# Altium footprint library ARCOM_Chips.PcbLib: 185 footprints (part 4 of 12)
Each footprint in its own frame and in the unit in brackets; x right, y up, seen from the top. Pads: shape width x height; smd on the part's side, far side on the other; paste and mask are expansions set on the pad; w line width, h text height; cw(c..) or ccw(c..) is an arc to the next point about the centre after c.
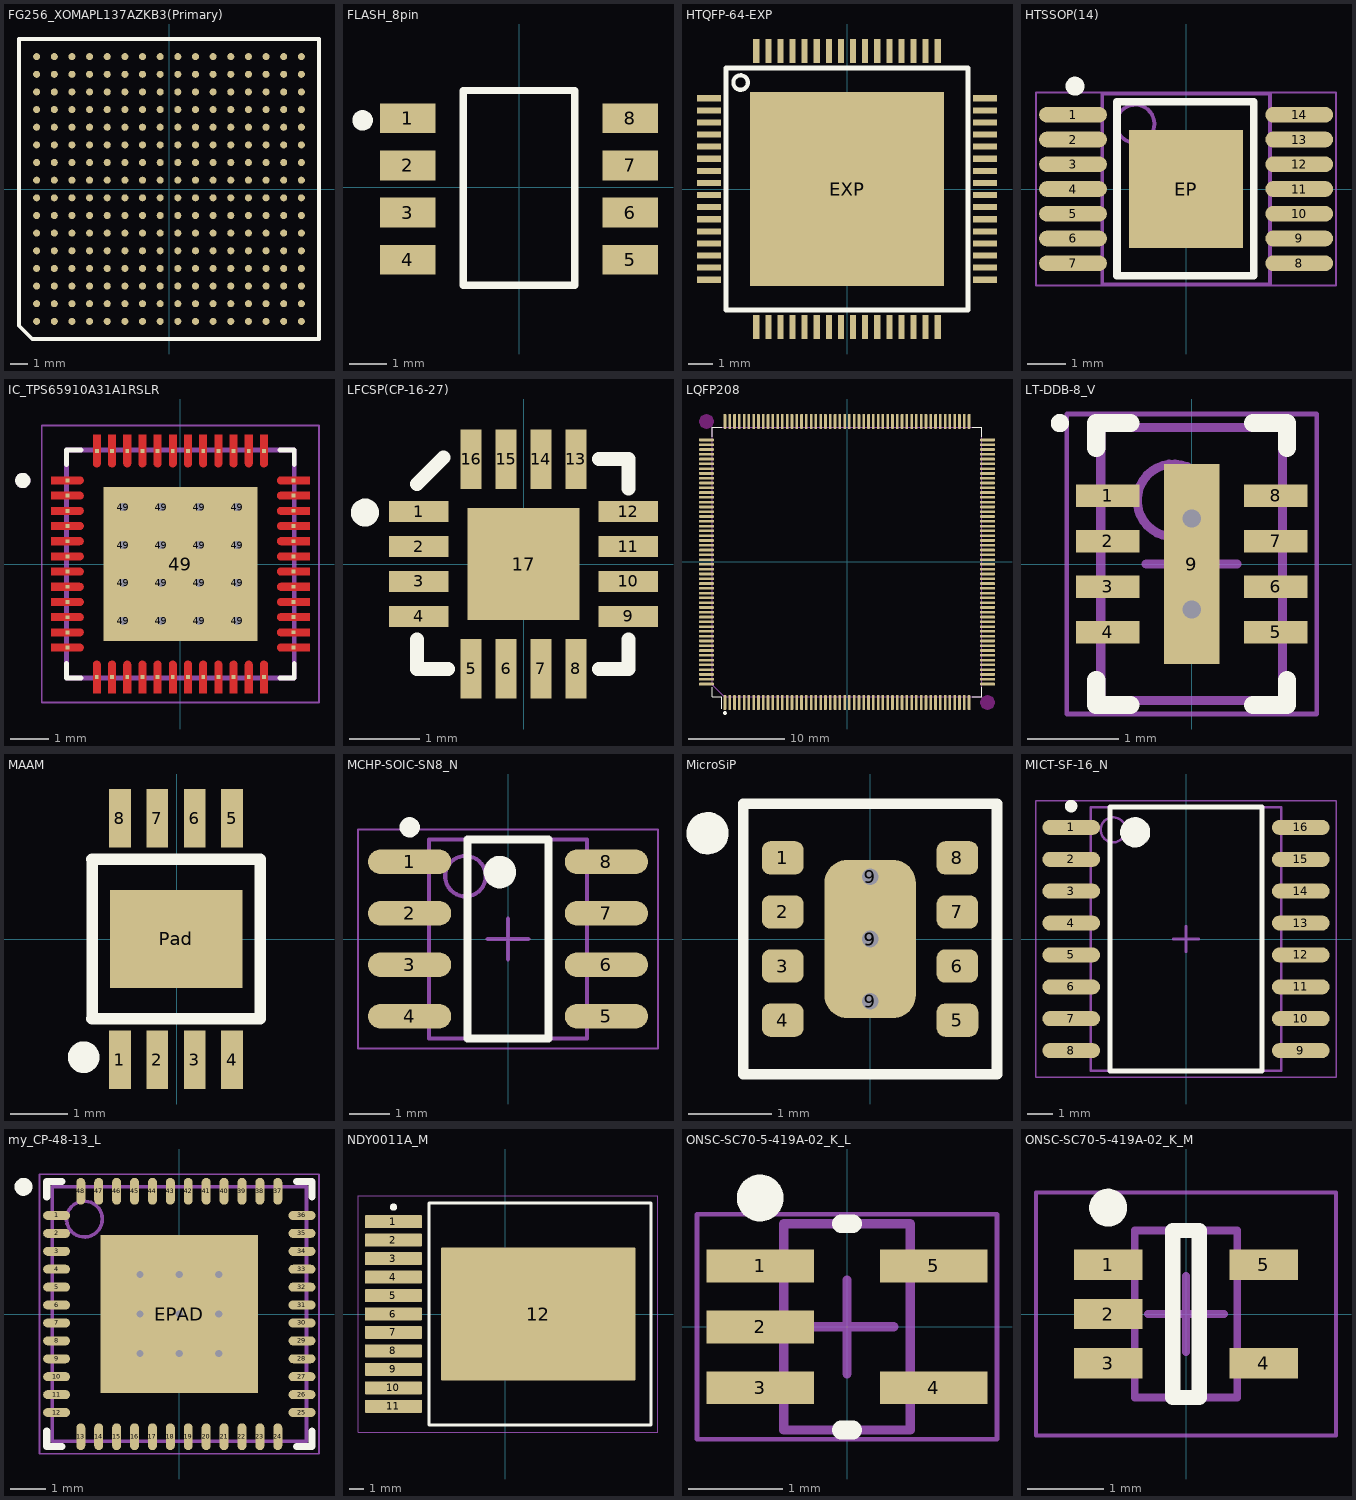
[diagram p3: the footprints below, top view; thin cyan lines are the x and y axes]

## FG256_XOMAPL137AZKB3(Primary) [mm]
pads (256):
  round 0.4 smd: A1(-7.5,-7.5) A2(-7.5,-6.5) A3(-7.5,-5.5) A4(-7.5,-4.5) A5(-7.5,-3.5) A6(-7.5,-2.5) A7(-7.5,-1.5) A8(-7.5,-0.5) A9(-7.5,0.5) A10(-7.5,1.5) A11(-7.5,2.5) A12(-7.5,3.5) A13(-7.5,4.5) A14(-7.5,5.5) A15(-7.5,6.5) A16(-7.5,7.5) B1(-6.5,-7.5) B2(-6.5,-6.5) B3(-6.5,-5.5) B4(-6.5,-4.5) B5(-6.5,-3.5) B6(-6.5,-2.5) B7(-6.5,-1.5) B8(-6.5,-0.5) B9(-6.5,0.5) B10(-6.5,1.5) B11(-6.5,2.5) B12(-6.5,3.5) B13(-6.5,4.5) B14(-6.5,5.5) B15(-6.5,6.5) B16(-6.5,7.5) C1(-5.5,-7.5) C2(-5.5,-6.5) C3(-5.5,-5.5) C4(-5.5,-4.5) C5(-5.5,-3.5) C6(-5.5,-2.5) C7(-5.5,-1.5) C8(-5.5,-0.5) C9(-5.5,0.5) C10(-5.5,1.5) C11(-5.5,2.5) C12(-5.5,3.5) C13(-5.5,4.5) C14(-5.5,5.5) C15(-5.5,6.5) C16(-5.5,7.5) D1(-4.5,-7.5) D2(-4.5,-6.5) D3(-4.5,-5.5) D4(-4.5,-4.5) D5(-4.5,-3.5) D6(-4.5,-2.5) D7(-4.5,-1.5) D8(-4.5,-0.5) D9(-4.5,0.5) D10(-4.5,1.5) D11(-4.5,2.5) D12(-4.5,3.5) D13(-4.5,4.5) D14(-4.5,5.5) D15(-4.5,6.5) D16(-4.5,7.5) E1(-3.5,-7.5) E2(-3.5,-6.5) E3(-3.5,-5.5) E4(-3.5,-4.5) E5(-3.5,-3.5) E6(-3.5,-2.5) E7(-3.5,-1.5) E8(-3.5,-0.5) E9(-3.5,0.5) E10(-3.5,1.5) E11(-3.5,2.5) E12(-3.5,3.5) E13(-3.5,4.5) E14(-3.5,5.5) E15(-3.5,6.5) E16(-3.5,7.5) F1(-2.5,-7.5) F2(-2.5,-6.5) F3(-2.5,-5.5) F4(-2.5,-4.5) F5(-2.5,-3.5) F6(-2.5,-2.5) F7(-2.5,-1.5) F8(-2.5,-0.5) F9(-2.5,0.5) F10(-2.5,1.5) F11(-2.5,2.5) F12(-2.5,3.5) F13(-2.5,4.5) F14(-2.5,5.5) F15(-2.5,6.5) F16(-2.5,7.5) G1(-1.5,-7.5) G2(-1.5,-6.5) G3(-1.5,-5.5) G4(-1.5,-4.5) G5(-1.5,-3.5) G6(-1.5,-2.5) G7(-1.5,-1.5) G8(-1.5,-0.5) G9(-1.5,0.5) G10(-1.5,1.5) G11(-1.5,2.5) G12(-1.5,3.5) G13(-1.5,4.5) G14(-1.5,5.5) G15(-1.5,6.5) G16(-1.5,7.5) H1(-0.5,-7.5) H2(-0.5,-6.5) H3(-0.5,-5.5) H4(-0.5,-4.5) H5(-0.5,-3.5) H6(-0.5,-2.5) H7(-0.5,-1.5) H8(-0.5,-0.5) H9(-0.5,0.5) H10(-0.5,1.5) H11(-0.5,2.5) H12(-0.5,3.5) H13(-0.5,4.5) H14(-0.5,5.5) H15(-0.5,6.5) H16(-0.5,7.5) J1(0.5,-7.5) J2(0.5,-6.5) J3(0.5,-5.5) J4(0.5,-4.5) J5(0.5,-3.5) J6(0.5,-2.5) J7(0.5,-1.5) J8(0.5,-0.5) J9(0.5,0.5) J10(0.5,1.5) J11(0.5,2.5) J12(0.5,3.5) J13(0.5,4.5) J14(0.5,5.5) J15(0.5,6.5) J16(0.5,7.5) K1(1.5,-7.5) K2(1.5,-6.5) K3(1.5,-5.5) K4(1.5,-4.5) K5(1.5,-3.5) K6(1.5,-2.5) K7(1.5,-1.5) K8(1.5,-0.5) K9(1.5,0.5) K10(1.5,1.5) K11(1.5,2.5) K12(1.5,3.5) K13(1.5,4.5) K14(1.5,5.5) K15(1.5,6.5) K16(1.5,7.5) L1(2.5,-7.5) L2(2.5,-6.5) L3(2.5,-5.5) L4(2.5,-4.5) L5(2.5,-3.5) L6(2.5,-2.5) L7(2.5,-1.5) L8(2.5,-0.5) L9(2.5,0.5) L10(2.5,1.5) L11(2.5,2.5) L12(2.5,3.5) L13(2.5,4.5) L14(2.5,5.5) L15(2.5,6.5) L16(2.5,7.5) M1(3.5,-7.5) M2(3.5,-6.5) M3(3.5,-5.5) M4(3.5,-4.5) M5(3.5,-3.5) M6(3.5,-2.5) M7(3.5,-1.5) M8(3.5,-0.5) M9(3.5,0.5) M10(3.5,1.5) M11(3.5,2.5) M12(3.5,3.5) M13(3.5,4.5) M14(3.5,5.5) M15(3.5,6.5) M16(3.5,7.5) N1(4.5,-7.5) N2(4.5,-6.5) N3(4.5,-5.5) N4(4.5,-4.5) N5(4.5,-3.5) N6(4.5,-2.5) N7(4.5,-1.5) N8(4.5,-0.5) N9(4.5,0.5) N10(4.5,1.5) N11(4.5,2.5) N12(4.5,3.5) N13(4.5,4.5) N14(4.5,5.5) N15(4.5,6.5) N16(4.5,7.5) P1(5.5,-7.5) P2(5.5,-6.5) P3(5.5,-5.5) P4(5.5,-4.5) P5(5.5,-3.5) P6(5.5,-2.5) P7(5.5,-1.5) P8(5.5,-0.5) P9(5.5,0.5) P10(5.5,1.5) P11(5.5,2.5) P12(5.5,3.5) P13(5.5,4.5) P14(5.5,5.5) P15(5.5,6.5) P16(5.5,7.5) R1(6.5,-7.5) R2(6.5,-6.5) R3(6.5,-5.5) R4(6.5,-4.5) R5(6.5,-3.5) R6(6.5,-2.5) R7(6.5,-1.5) R8(6.5,-0.5) R9(6.5,0.5) R10(6.5,1.5) R11(6.5,2.5) R12(6.5,3.5) R13(6.5,4.5) R14(6.5,5.5) R15(6.5,6.5) R16(6.5,7.5) T1(7.5,-7.5) T2(7.5,-6.5) T3(7.5,-5.5) T4(7.5,-4.5) T5(7.5,-3.5) T6(7.5,-2.5) T7(7.5,-1.5) T8(7.5,-0.5) T9(7.5,0.5) T10(7.5,1.5) T11(7.5,2.5) T12(7.5,3.5) T13(7.5,4.5) T14(7.5,5.5) T15(7.5,6.5) T16(7.5,7.5)
Top Overlay:
  lines w0.2: -8.5,-7.75 -8.5,8.5 8.5,8.5 8.5,-6.5 8.5,-8.5 -7.75,-8.5 -8.5,-7.75
3D body "XC6SLX9-2FTG256I.stp": height 1.55, standoff 0, extent -8.501,-8.494 8.499,8.506

## FLASH_8pin [mm]
pads (8):
  rect 1.5x0.8 smd: 1(-3.003,1.862) 2(-3.003,0.592) 3(-3.003,-0.678) 4(-3.003,-1.948) 5(2.997,-1.948) 6(2.997,-0.678) 7(2.997,0.592) 8(2.997,1.862)
Top Overlay:
  circle w0.3: c-4.216,1.807 r0.125
  lines w0.2: -1.503,-2.638 -1.503,2.612 1.497,2.612 1.497,-2.638 -1.503,-2.638

## HTQFP-64-EXP [mm]
pads (65):
  rect 1x0.25 smd: 1(-5.7,3.75) 2(-5.7,3.25) 3(-5.7,2.75) 4(-5.7,2.25) 5(-5.7,1.75) 6(-5.7,1.25) 7(-5.7,0.75) 8(-5.7,0.25) 9(-5.7,-0.25) 10(-5.7,-0.75) 11(-5.7,-1.25) 12(-5.7,-1.75) 13(-5.7,-2.25) 14(-5.7,-2.75) 15(-5.7,-3.25) 16(-5.7,-3.75) 33(5.7,-3.75) 34(5.7,-3.25) 35(5.7,-2.75) 36(5.7,-2.25) 37(5.7,-1.75) 38(5.7,-1.25) 39(5.7,-0.75) 40(5.7,-0.25) 41(5.7,0.25) 42(5.7,0.75) 43(5.7,1.25) 44(5.7,1.75) 45(5.7,2.25) 46(5.7,2.75) 47(5.7,3.25) 48(5.7,3.75)
  rect 0.25x1 smd: 17(-3.75,-5.7) 18(-3.25,-5.7) 19(-2.75,-5.7) 20(-2.25,-5.7) 21(-1.75,-5.7) 22(-1.25,-5.7) 23(-0.75,-5.7) 24(-0.25,-5.7) 25(0.25,-5.7) 26(0.75,-5.7) 27(1.25,-5.7) 28(1.75,-5.7) 29(2.25,-5.7) 30(2.75,-5.7) 31(3.25,-5.7) 32(3.75,-5.7) 49(3.75,5.7) 50(3.25,5.7) 51(2.75,5.7) 52(2.25,5.7) 53(1.75,5.7) 54(1.25,5.7) 55(0.75,5.7) 56(0.25,5.7) 57(-0.25,5.7) 58(-0.75,5.7) 59(-1.25,5.7) 60(-1.75,5.7) 61(-2.25,5.7) 62(-2.75,5.7) 63(-3.25,5.7) 64(-3.75,5.7)
  rect 8x8 smd: EXP(0,0)
Top Overlay:
  circle w0.17: c-4.4,4.4 r0.3
  lines w0.203: -5,-5 5,-5 5,5 -5,5 -5,-5

## HTSSOP(14) [mm]
pads (15):
  oval 1.78x0.42 smd: 1(-2.97,1.95) 2(-2.97,1.3) 3(-2.97,0.65) 4(-2.97,0) 5(-2.97,-0.65) 6(-2.97,-1.3) 7(-2.97,-1.95) 8(2.97,-1.95) 9(2.97,-1.3) 10(2.97,-0.65) 11(2.97,0) 12(2.97,0.65) 13(2.97,1.3) 14(2.97,1.95)
  rect 3x3.1 smd: EP(0,0)
Top Overlay:
  circle w0.25: c-2.918,2.7 r0.125
  lines w0.2: -1.816,-2.276 -1.816,2.296 1.773,2.296 1.773,-2.276 -1.816,-2.276
Mechanical 13:
  circle w0.1: c-1.333,1.712 r0.5
  lines w0.1: -2.2,-2.5 -2.2,2.5 2.2,2.5 2.2,-2.5 -2.2,-2.5
M15 Top Assy:
  lines w0.05: -3.942,-2.532 -3.942,2.532 3.937,2.532 3.937,-2.532 -3.942,-2.532
  lines w0.1: -0.5,0 0.5,0 ; 0,-0.5 0,0.5

## IC_TPS65910A31A1RSLR [mm]
pads (65):
  rect 0.1x0.1 smd paste-1 mask+0: 1(-2.975,2.2) 2(-2.975,1.8) 3(-2.975,1.399) 4(-2.975,0.999) 5(-2.975,0.599) 6(-2.975,0.199) 7(-2.975,-0.201) 8(-2.975,-0.601) 9(-2.975,-1.001) 10(-2.975,-1.401) 11(-2.975,-1.801) 12(-2.975,-2.201) 13(-2.2,-2.975) 14(-1.8,-2.975) 15(-1.4,-2.975) 16(-1,-2.975) 17(-0.6,-2.975) 18(-0.2,-2.975) 19(0.2,-2.975) 20(0.6,-2.975) 21(1,-2.975) 22(1.4,-2.975) 23(1.8,-2.975) 24(2.2,-2.975) 25(2.975,-2.2) 26(2.975,-1.8) 27(2.975,-1.4) 28(2.975,-1) 29(2.975,-0.6) 30(2.975,-0.2) 31(2.975,0.2) 32(2.975,0.6) 33(2.975,1) 34(2.975,1.4) 35(2.975,1.8) 36(2.975,2.2) 37(2.201,2.975) 38(1.8,2.975) 39(1.401,2.975) 40(1.001,2.975) 41(0.601,2.975) 42(0.201,2.975) 43(-0.199,2.975) 44(-0.599,2.975) 45(-0.999,2.975) 46(-1.399,2.975) 47(-1.8,2.975) 48(-2.2,2.975)
  round 0.4 hole 0.2 mask+0: 49(-1.5,-1.5) 49(-1.5,-0.5) 49(-1.5,0.5) 49(-1.5,1.5) 49(-0.5,-1.5) 49(-0.5,-0.5) 49(-0.5,0.5) 49(-0.5,1.5) 49(0.5,-1.5) 49(0.5,-0.5) 49(0.5,0.5) 49(0.5,1.5) 49(1.5,-1.5) 49(1.5,-0.5) 49(1.5,0.5) 49(1.5,1.5)
  rect 4.05x4.05 smd paste-1.5: 49(0,0)
Top Layer:
  drawing of 48 lines, arcs and shapes, not listed
Top Overlay:
  circle w0.2: c-4.15,2.2 r0.1
  lines w0.127: -3,-2.62 -3,-3 -2.62,-3 ; -3,2.62 -3,3 -2.62,3 ; 2.62,-3 3,-3 3,-2.62 ; 2.62,3 3,3 3,2.62
Top Paste:
  drawing of 57 lines, arcs and shapes, not listed
Top Solder:
  drawing of 48 lines, arcs and shapes, not listed
Mechanical 13:
  circle w0.2: c-4.15,2.2 r0.1
  lines w0.127: -3,-3 -3,3 3,3 3,-3 -3,-3
M15 Top Assy:
  lines w0.05: -3.65,-3.65 -3.65,3.65 3.65,3.65 3.65,-3.65 -3.65,-3.65
3D body "User Library-QFN 48 6x6 pitch 0_4.STEP": height 0.65, standoff -0.02, extent -3.02,-3.02 3.02,3.02

## LFCSP(CP-16-27) [mm]
pads (17):
  rect 0.85x0.3 smd: 1(-1.5,0.75) 2(-1.5,0.25) 3(-1.5,-0.25) 4(-1.5,-0.75) 9(1.5,-0.75) 10(1.5,-0.25) 11(1.5,0.25) 12(1.5,0.75)
  rect 0.3x0.85 smd: 5(-0.75,-1.5) 6(-0.25,-1.5) 7(0.25,-1.5) 8(0.75,-1.5) 13(0.75,1.5) 14(0.25,1.5) 15(-0.25,1.5) 16(-0.75,1.5)
  rect 1.6x1.6 smd: 17(0,0)
Top Overlay:
  circle w0.2: c-2.269,0.737 r0.1
  lines w0.2: -1.524,-1.079 -1.524,-1.5 -1.079,-1.5 ; -1.524,1.143 -1.143,1.524 ; 1.079,-1.5 1.5,-1.5 1.5,-1.079 ; 1.079,1.5 1.5,1.5 1.5,1.079

## LQFP208 [mm]
pads (208):
  rrect50% 0.28x1.56 smd: 1(-12.75,-14.68) 2(-12.25,-14.68) 3(-11.75,-14.68) 4(-11.25,-14.68) 5(-10.75,-14.68) 6(-10.25,-14.68) 7(-9.75,-14.68) 8(-9.25,-14.68) 9(-8.75,-14.68) 10(-8.25,-14.68) 11(-7.75,-14.68) 12(-7.25,-14.68) 13(-6.75,-14.68) 14(-6.25,-14.68) 15(-5.75,-14.68) 16(-5.25,-14.68) 17(-4.75,-14.68) 18(-4.25,-14.68) 19(-3.75,-14.68) 20(-3.25,-14.68) 21(-2.75,-14.68) 22(-2.25,-14.68) 23(-1.75,-14.68) 24(-1.25,-14.68) 25(-0.75,-14.68) 26(-0.25,-14.68) 27(0.25,-14.68) 28(0.75,-14.68) 29(1.25,-14.68) 30(1.75,-14.68) 31(2.25,-14.68) 32(2.75,-14.68) 33(3.25,-14.68) 34(3.75,-14.68) 35(4.25,-14.68) 36(4.75,-14.68) 37(5.25,-14.68) 38(5.75,-14.68) 39(6.25,-14.68) 40(6.75,-14.68) 41(7.25,-14.68) 42(7.75,-14.68) 43(8.25,-14.68) 44(8.75,-14.68) 45(9.25,-14.68) 46(9.75,-14.68) 47(10.25,-14.68) 48(10.75,-14.68) 49(11.25,-14.68) 50(11.75,-14.68) 51(12.25,-14.68) 52(12.75,-14.68) 105(12.75,14.68) 106(12.25,14.68) 107(11.75,14.68) 108(11.25,14.68) 109(10.75,14.68) 110(10.25,14.68) 111(9.75,14.68) 112(9.25,14.68) 113(8.75,14.68) 114(8.25,14.68) 115(7.75,14.68) 116(7.25,14.68) 117(6.75,14.68) 118(6.25,14.68) 119(5.75,14.68) 120(5.25,14.68) 121(4.75,14.68) 122(4.25,14.68) 123(3.75,14.68) 124(3.25,14.68) 125(2.75,14.68) 126(2.25,14.68) 127(1.75,14.68) 128(1.25,14.68) 129(0.75,14.68) 130(0.25,14.68) 131(-0.25,14.68) 132(-0.75,14.68) 133(-1.25,14.68) 134(-1.75,14.68) 135(-2.25,14.68) 136(-2.75,14.68) 137(-3.25,14.68) 138(-3.75,14.68) 139(-4.25,14.68) 140(-4.75,14.68) 141(-5.25,14.68) 142(-5.75,14.68) 143(-6.25,14.68) 144(-6.75,14.68) 145(-7.25,14.68) 146(-7.75,14.68) 147(-8.25,14.68) 148(-8.75,14.68) 149(-9.25,14.68) 150(-9.75,14.68) 151(-10.25,14.68) 152(-10.75,14.68) 153(-11.25,14.68) 154(-11.75,14.68) 155(-12.25,14.68) 156(-12.75,14.68)
  rrect50% 1.56x0.28 smd: 53(14.68,-12.75) 54(14.68,-12.25) 55(14.68,-11.75) 56(14.68,-11.25) 57(14.68,-10.75) 58(14.68,-10.25) 59(14.68,-9.75) 60(14.68,-9.25) 61(14.68,-8.75) 62(14.68,-8.25) 63(14.68,-7.75) 64(14.68,-7.25) 65(14.68,-6.75) 66(14.68,-6.25) 67(14.68,-5.75) 68(14.68,-5.25) 69(14.68,-4.75) 70(14.68,-4.25) 71(14.68,-3.75) 72(14.68,-3.25) 73(14.68,-2.75) 74(14.68,-2.25) 75(14.68,-1.75) 76(14.68,-1.25) 77(14.68,-0.75) 78(14.68,-0.25) 79(14.68,0.25) 80(14.68,0.75) 81(14.68,1.25) 82(14.68,1.75) 83(14.68,2.25) 84(14.68,2.75) 85(14.68,3.25) 86(14.68,3.75) 87(14.68,4.25) 88(14.68,4.75) 89(14.68,5.25) 90(14.68,5.75) 91(14.68,6.25) 92(14.68,6.75) 93(14.68,7.25) 94(14.68,7.75) 95(14.68,8.25) 96(14.68,8.75) 97(14.68,9.25) 98(14.68,9.75) 99(14.68,10.25) 100(14.68,10.75) 101(14.68,11.25) 102(14.68,11.75) 103(14.68,12.25) 104(14.68,12.75) 157(-14.68,12.75) 158(-14.68,12.25) 159(-14.68,11.75) 160(-14.68,11.25) 161(-14.68,10.75) 162(-14.68,10.25) 163(-14.68,9.75) 164(-14.68,9.25) 165(-14.68,8.75) 166(-14.68,8.25) 167(-14.68,7.75) 168(-14.68,7.25) 169(-14.68,6.75) 170(-14.68,6.25) 171(-14.68,5.75) 172(-14.68,5.25) 173(-14.68,4.75) 174(-14.68,4.25) 175(-14.68,3.75) 176(-14.68,3.25) 177(-14.68,2.75) 178(-14.68,2.25) 179(-14.68,1.75) 180(-14.68,1.25) 181(-14.68,0.75) 182(-14.68,0.25) 183(-14.68,-0.25) 184(-14.68,-0.75) 185(-14.68,-1.25) 186(-14.68,-1.75) 187(-14.68,-2.25) 188(-14.68,-2.75) 189(-14.68,-3.25) 190(-14.68,-3.75) 191(-14.68,-4.25) 192(-14.68,-4.75) 193(-14.68,-5.25) 194(-14.68,-5.75) 195(-14.68,-6.25) 196(-14.68,-6.75) 197(-14.68,-7.25) 198(-14.68,-7.75) 199(-14.68,-8.25) 200(-14.68,-8.75) 201(-14.68,-9.25) 202(-14.68,-9.75) 203(-14.68,-10.25) 204(-14.68,-10.75) 205(-14.68,-11.25) 206(-14.68,-11.75) 207(-14.68,-12.25) 208(-14.68,-12.75)
Top Layer keep-out:
  region: -13.93,14.68 -13.93,14.754 -13.959,14.899 -14.015,15.035 -14.097,15.158 -14.202,15.263 -14.325,15.345 -14.461,15.401 -14.606,15.43 -14.68,15.43 -14.754,15.43 -14.899,15.401 -15.035,15.345 -15.158,15.263 -15.263,15.158 -15.345,15.035 -15.401,14.899 -15.43,14.754 -15.43,14.68 -15.43,14.606 -15.401,14.461 -15.345,14.325 -15.263,14.202 -15.158,14.097 -15.035,14.015 -14.899,13.959 -14.754,13.93 -14.68,13.93 -14.606,13.93 -14.461,13.959 -14.325,14.015 -14.202,14.097 -14.097,14.202 -14.015,14.325 -13.959,14.461 -13.93,14.606
  region: 15.43,-14.68 15.43,-14.606 15.401,-14.461 15.345,-14.325 15.263,-14.202 15.158,-14.097 15.035,-14.015 14.899,-13.959 14.754,-13.93 14.68,-13.93 14.606,-13.93 14.461,-13.959 14.325,-14.015 14.202,-14.097 14.097,-14.202 14.015,-14.325 13.959,-14.461 13.93,-14.606 13.93,-14.68 13.93,-14.754 13.959,-14.899 14.015,-15.035 14.097,-15.158 14.202,-15.263 14.325,-15.345 14.461,-15.401 14.606,-15.43 14.68,-15.43 14.754,-15.43 14.899,-15.401 15.035,-15.345 15.158,-15.263 15.263,-15.158 15.345,-15.035 15.401,-14.899 15.43,-14.754
Top Overlay:
  circle w0.2: c-12.75,-15.78 r0.1
  lines w0.12: -14.1,-13.07 -14.1,-14.1 -13.07,-14.1 -13.07,-15.34 ; -14.1,13.07 -14.1,14.1 -13.07,14.1 ; 13.07,-14.1 14.1,-14.1 14.1,-13.07 ; 13.07,14.1 14.1,14.1 14.1,13.07
M15 Top Assy:
  lines w0.12: -14.1,-12.83 -14.1,14.1 14.1,14.1 14.1,-14.1 -12.83,-14.1 -14.1,-12.83

## LT-DDB-8_V [mm] "SON, 8-Leads, Body 3x2mm, Pitch 0.5mm, Thermal Pad 2.2x0.61mm"
height 0.8
pads (9):
  rect 0.7x0.25 smd mask+0.051: 1(-0.925,0.75) 2(-0.925,0.25) 3(-0.925,-0.25) 4(-0.925,-0.75) 5(0.925,-0.75) 6(0.925,-0.25) 7(0.925,0.25) 8(0.925,0.75)
  rect 0.61x2.2 smd mask+0.102: 9(0,0)
via 0,-0.5 diameter 0.5 hole 0.2
via 0,0.5 diameter 0.5 hole 0.2
Top Overlay:
  circle w0.1: c-1.45,1.55 r0.05
  lines w0.2: -1.05,-1.275 -1.05,-1.55 -0.675,-1.55 ; -1.05,1.275 -1.05,1.55 -0.675,1.55 ; 0.675,-1.55 1.05,-1.55 1.05,-1.275 ; 0.675,1.55 1.05,1.55 1.05,1.275
Mechanical 13:
  circle w0.1: c-0.2,0.7 r0.4
  lines w0.1: -1,-1.5 1,-1.5 1,1.5 -1,1.5 -1,-1.5
M15 Top Assy:
  lines w0.05: -1.375,-1.65 1.375,-1.65 1.375,1.65 -1.375,1.65 -1.375,-1.65
  lines w0.1: -0.5,0 0.5,0 ; 0,-0.5 0,0.5
3D body: height 0.8, standoff 0, extent -1,-1.5 1,1.5

## MAAM [mil]
pads (9):
  rect 15x40 smd: 1(-39,-82.22) 2(-13.4,-82.22) 3(12.2,-82.22) 4(37.8,-82.22) 5(37.8,82.78) 6(12.2,82.78) 7(-13.4,82.78) 8(-39,82.78)
  rect 90.55x66.93 smd: Pad(-0.5,0.3)
Top Overlay:
  circle w11.81: c-63.66,-80.48 r4.92
  lines w7.87: -57.98,-54.03 -57.98,54.63 57,54.63 56.98,-54.03 -58,-54.07

## MCHP-SOIC-SN8_N [mm] "SOIC, 8-Leads, Body 4.9x3.9mm, Pitch 1.27mm, IPC Medium Density"
height 1.75
pads (8):
  oval 2.05x0.6 smd: 1(-2.425,1.905) 2(-2.425,0.635) 3(-2.425,-0.635) 4(-2.425,-1.905) 5(2.425,-1.905) 6(2.425,-0.635) 7(2.425,0.635) 8(2.425,1.905)
Top Overlay:
  circle w0.25: c-2.425,2.755 r0.125
  circle w0.4: c-0.2,1.65 r0.2
  lines w0.2: -1,-2.45 -1,2.45 1,2.45 1,-2.45 -1,-2.45
Mechanical 13:
  circle w0.1: c-1.05,1.55 r0.5
  lines w0.1: -1.95,-2.45 -1.95,2.45 1.95,2.45 1.95,-2.45 -1.95,-2.45
M15 Top Assy:
  lines w0.05: -3.7,-2.7 -3.7,2.7 3.7,2.7 3.7,-2.7 -3.7,-2.7
  lines w0.1: -0.5,0 0.5,0 ; 0,-0.5 0,0.5
3D body: height 1.75, standoff 0.1, extent -1.95,-2.45 1.95,2.45

## MicroSiP [mm] "8-smd module, 0.12\" L x 0.11\" W x 0.06\" H (3.0mm x 2.8mm x 1.5mm)"
pads (12):
  rrect50% 0.5x0.4 smd mask+0.051: 1(-1.05,0.975) 2(-1.05,0.325) 3(-1.05,-0.325) 4(-1.05,-0.975) 5(1.049,-0.975) 6(1.049,-0.325) 7(1.049,0.325) 8(1.049,0.975)
  round 0.3 hole 0.2: 9(0,-0.75) 9(0,0) 9(0,0.75)
  rrect50% 1.1x1.9 smd mask+0.051: 9(0,0)
Top Overlay:
  lines w0.127: -1.524,-1.626 -1.524,1.626 1.524,1.626 1.524,-1.626 -1.524,-1.626
  lines w0.254: -1.829,1.295 ccw(c-1.953,1.27) -1.826,1.27
3D body "User Library-MicroSip=-1,53.STEP": height 1.52, standoff -0.08, extent -1.45,-1.55 1.45,1.55

## MICT-SF-16_N [mm] "SOIC, 16-Leads, Body 10.3x7.5mm, Pitch 1.27mm, IPC Medium Density"
pads (16):
  oval 2.3x0.6 smd: 1(-4.575,4.445) 2(-4.575,3.175) 3(-4.575,1.905) 4(-4.575,0.635) 5(-4.575,-0.635) 6(-4.575,-1.905) 7(-4.575,-3.175) 8(-4.575,-4.445) 9(4.575,-4.445) 10(4.575,-3.175) 11(4.575,-1.905) 12(4.575,-0.635) 13(4.575,0.635) 14(4.575,1.905) 15(4.575,3.175) 16(4.575,4.445)
Top Overlay:
  circle w0.25: c-4.575,5.295 r0.125
  circle w0.6: c-2.025,4.25 r0.3
  lines w0.2: -3.025,-5.25 -3.025,5.25 3.025,5.25 3.025,-5.25 -3.025,-5.25
Mechanical 13:
  circle w0.1: c-2.9,4.35 r0.5
  lines w0.1: -3.8,-5.25 -3.8,5.25 3.8,5.25 3.8,-5.25 -3.8,-5.25
M15 Top Assy:
  lines w0.05: -5.975,-5.5 -5.975,5.5 5.975,5.5 5.975,-5.5 -5.975,-5.5
  lines w0.1: -0.5,0 0.5,0 ; 0,-0.5 0,0.5
3D body: height 0.1, standoff 0, extent -3.8,-5.25 3.8,5.25

## my_CP-48-13_L [mm] "QFN, 48-Leads, Body 7x7mm, Pitch 0.5mm, Thermal Pad 5.6x5.6mm, IPC High Density"
height 0.8
pads (49):
  oval 0.75x0.25 smd: 1(-3.425,2.75) 2(-3.425,2.25) 3(-3.425,1.75) 4(-3.425,1.25) 5(-3.425,0.75) 6(-3.425,0.25) 7(-3.425,-0.25) 8(-3.425,-0.75) 9(-3.425,-1.25) 10(-3.425,-1.75) 11(-3.425,-2.25) 12(-3.425,-2.75) 25(3.425,-2.75) 26(3.425,-2.25) 27(3.425,-1.75) 28(3.425,-1.25) 29(3.425,-0.75) 30(3.425,-0.25) 31(3.425,0.25) 32(3.425,0.75) 33(3.425,1.25) 34(3.425,1.75) 35(3.425,2.25) 36(3.425,2.75)
  oval 0.25x0.75 smd: 13(-2.75,-3.425) 14(-2.25,-3.425) 15(-1.75,-3.425) 16(-1.25,-3.425) 17(-0.75,-3.425) 18(-0.25,-3.425) 19(0.25,-3.425) 20(0.75,-3.425) 21(1.25,-3.425) 22(1.75,-3.425) 23(2.25,-3.425) 24(2.75,-3.425) 37(2.75,3.425) 38(2.25,3.425) 39(1.75,3.425) 40(1.25,3.425) 41(0.75,3.425) 42(0.25,3.425) 43(-0.25,3.425) 44(-0.75,3.425) 45(-1.25,3.425) 46(-1.75,3.425) 47(-2.25,3.425) 48(-2.75,3.425)
  rect 4.4x4.4 smd: EPAD(0,0)
via 1.1,-1.1 diameter 0.5 hole 0.2
via 0,-1.1 diameter 0.5 hole 0.2
via -1.1,-1.1 diameter 0.5 hole 0.2
via 1.1,0 diameter 0.5 hole 0.2
via 0,0 diameter 0.5 hole 0.2
via -1.1,0 diameter 0.5 hole 0.2
via 1.1,1.1 diameter 0.5 hole 0.2
via 0,1.1 diameter 0.5 hole 0.2
via -1.1,1.1 diameter 0.5 hole 0.2
Top Overlay:
  circle w0.25: c-4.35,3.55 r0.125
  lines w0.2: -3.7,-3.275 -3.7,-3.7 -3.275,-3.7 ; -3.7,3.275 -3.7,3.7 -3.275,3.7 ; 3.275,-3.7 3.7,-3.7 3.7,-3.275 ; 3.275,3.7 3.7,3.7 3.7,3.275
Mechanical 13:
  circle w0.1: c-2.65,2.65 r0.5
  lines w0.1: -3.55,-3.55 3.55,-3.55 3.55,3.55 -3.55,3.55 -3.55,-3.55
M15 Top Assy:
  lines w0.05: -3.9,-3.9 3.9,-3.9 3.9,3.9 -3.9,3.9 -3.9,-3.9
  lines w0.1: -0.5,0 0.5,0 ; 0,-0.5 0,0.5
3D body: height 0.8, standoff 0, extent -3.55,-3.55 3.55,3.55

## NDY0011A_M [mm] "DPAK, 11-Leads, Body 15.25x15.25mm, Pitch 1.27mm, IPC Low Density"
height 6
pads (12):
  rrect11% 3.9x0.9 smd: 1(-7.7,6.35) 2(-7.7,5.08) 3(-7.7,3.81) 4(-7.7,2.54) 5(-7.7,1.27) 6(-7.7,0) 7(-7.7,-1.27) 8(-7.7,-2.54) 9(-7.7,-3.81) 10(-7.7,-5.08) 11(-7.7,-6.35)
  rrect1% 13.37x9.126 smd: 12(2.25,0)
Top Overlay:
  circle w0.25: c-7.7,7.35 r0.125
  lines w0.2: -5.25,-7.625 -5.25,7.625 10,7.625 10,-7.625 -5.25,-7.625
Mechanical 1:
  text ".Designator" at -3.048,-0.635 h2
Mechanical 13:
  lines w0.1: -5.25,-7.625 10,-7.625 10,7.625 -5.25,7.625 -5.25,-7.625
M15 Top Assy:
  lines w0.05: -10.138,-8.125 10.487,-8.125 10.487,8.125 -10.138,8.125 -10.138,-8.125
  lines w0.1: -0.5,0 0.5,0 ; 0,-0.5 0,0.5
3D body "NDY0011A.stp": height 6.11, standoff 0, extent -7.78,-7.5 10,7.5

## ONSC-SC70-5-419A-02_K_L [mm] "SOT23, 5-Leads, Body 2.2x1.35mm, Pitch 0.65mm, IPC High Density"
height 1.1
pads (5):
  rect 1.15x0.35 smd: 1(-0.925,0.65) 2(-0.925,0) 3(-0.925,-0.65) 4(0.925,-0.65) 5(0.925,0.65)
Top Overlay:
  circle w0.25: c-0.925,1.375 r0.125
  lines w0.2: -0.06,-1.1 0.06,-1.1 ; -0.06,1.1 0.06,1.1
Mechanical 13:
  lines w0.1: -0.675,-1.1 0.675,-1.1 0.675,1.1 -0.675,1.1 -0.675,-1.1
M15 Top Assy:
  lines w0.05: -1.6,-1.2 1.6,-1.2 1.6,1.2 -1.6,1.2 -1.6,-1.2
  lines w0.1: -0.5,0 0.5,0 ; 0,-0.5 0,0.5
3D body: height 1.1, standoff 0, extent -0.675,-1.1 0.675,1.1

## ONSC-SC70-5-419A-02_K_M [mm] "SOT23, 5-Leads, Body 2.2x1.35mm, Pitch 0.65mm, IPC Low Density"
height 1.1
pads (5):
  rect 0.9x0.4 smd: 1(-1.025,0.65) 2(-1.025,0) 3(-1.025,-0.65) 4(1.025,-0.65) 5(1.025,0.65)
Top Overlay:
  circle w0.25: c-1.025,1.4 r0.125
  lines w0.2: -0.175,-1.1 -0.175,1.1 0.175,1.1 0.175,-1.1 -0.175,-1.1
Mechanical 13:
  lines w0.1: -0.675,-1.1 0.675,-1.1 0.675,1.1 -0.675,1.1 -0.675,-1.1
M15 Top Assy:
  lines w0.05: -1.975,-1.6 1.975,-1.6 1.975,1.6 -1.975,1.6 -1.975,-1.6
  lines w0.1: -0.5,0 0.5,0 ; 0,-0.5 0,0.5
3D body: height 1.1, standoff 0, extent -0.675,-1.1 0.675,1.1